# Altium footprint library NASCO 3D PCBLIB.PcbLib: 108 footprints (part 1 of 7)
Each footprint in its own frame and in the unit in brackets; x right, y up, seen from the top. Pads: shape width x height; smd on the part's side, far side on the other; paste and mask are expansions set on the pad; w line width, h text height; cw(c..) or ccw(c..) is an arc to the next point about the centre after c.
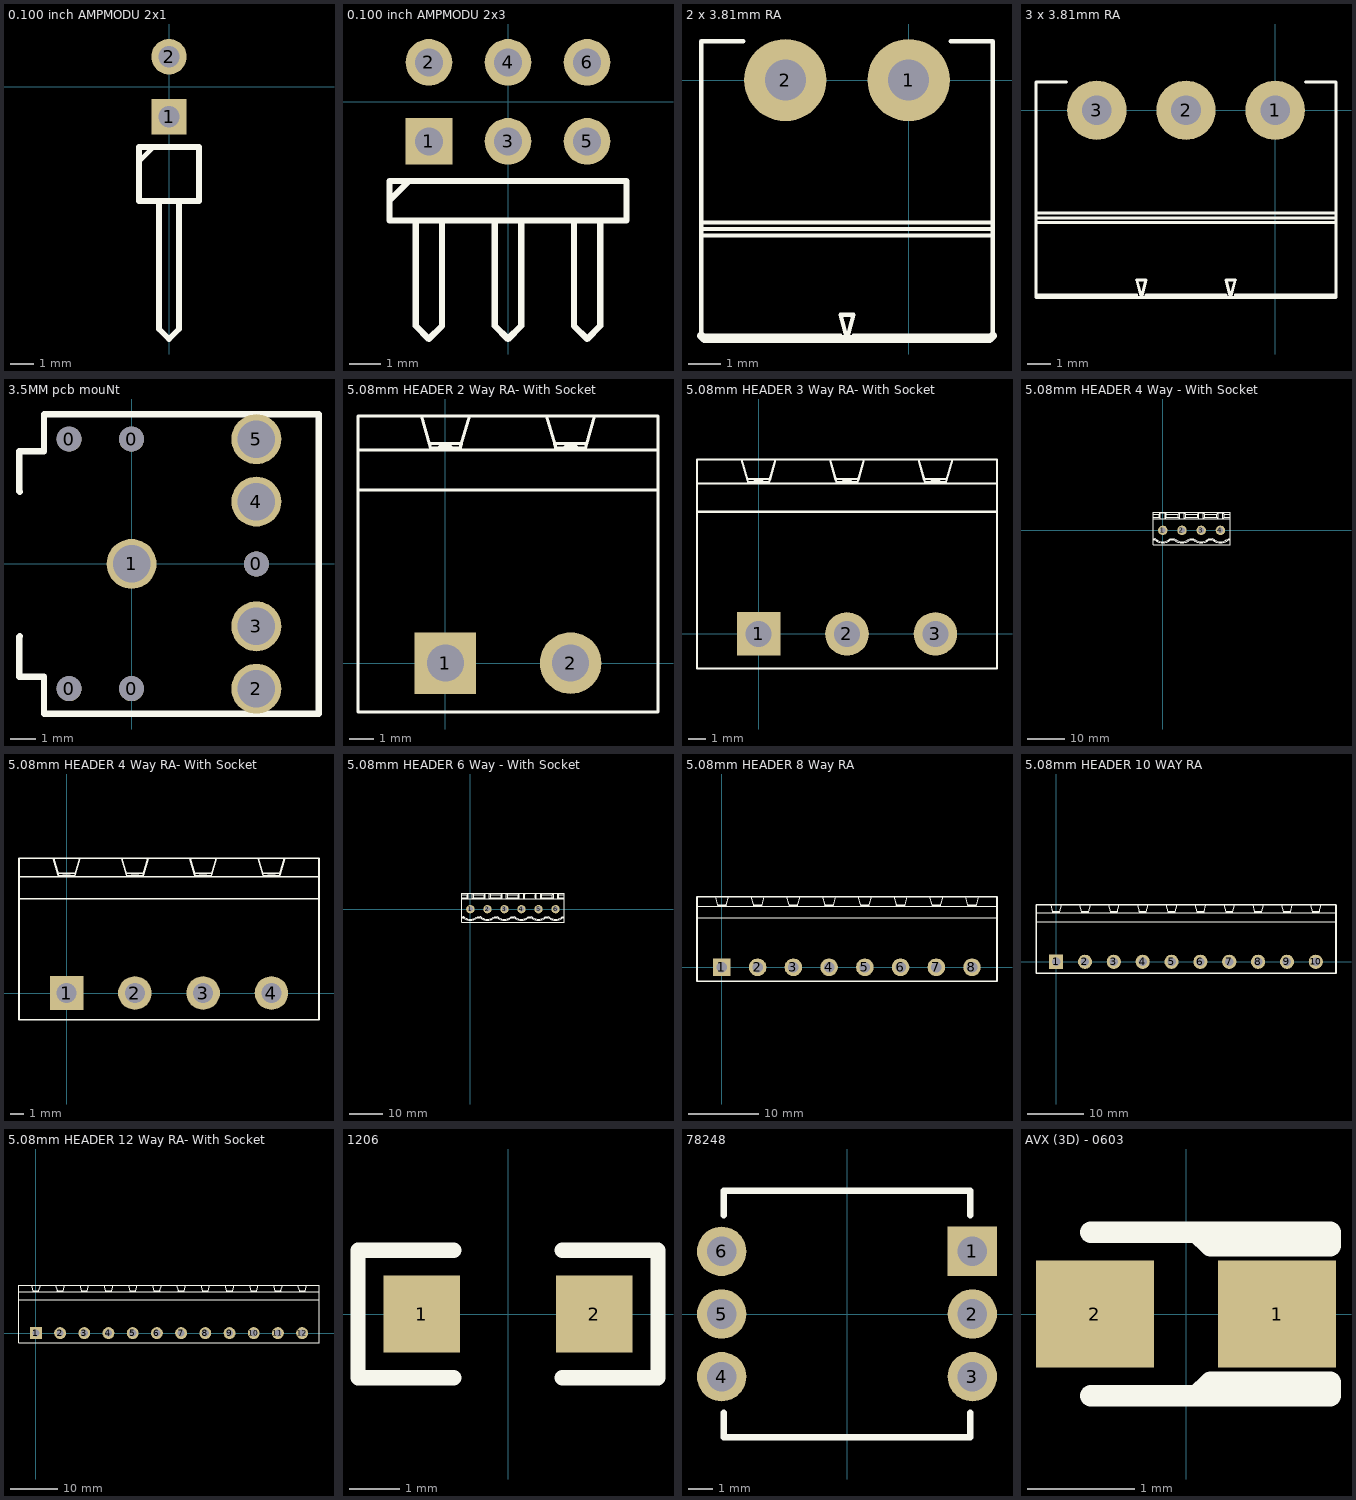
[diagram p0: the footprints below, top view; thin cyan lines are the x and y axes]

## 0.100 inch AMPMODU 2x1 [mm] "0.100 inch AMPMODU 2x1"
pads (2):
  rect 1.5x1.5 hole 0.9: 1(0,-1.27)
  round 1.5 hole 0.9: 2(0,1.27)
Top Overlay:
  lines w0.2: -1.27,-3.81 -1.27,-2.54 ; -1.27,-3.175 -0.635,-2.54 ; -0.423,-6.858 -0.423,-10.245 0,-10.668 0.423,-10.245 0.423,-6.858 ; 1.27,-3.81 1.27,-2.54
  lines w0.254: -0.423,-4.868 -0.423,-10.245 0,-10.668 ; 0.508,-4.826 0.423,-4.911 0.423,-10.245 0,-10.668 ; -1.27,-2.54 1.27,-2.54 ; -1.27,-2.54 -1.27,-4.826 1.27,-4.826 1.27,-2.54 ; -1.27,-2.54 1.27,-2.54 ; 0,-10.668 0,-10.668 ; 0,-10.668 0,-10.668
3D body "c-103330-1-m-3d.stp": height 6.06, standoff -3.03, extent -1.067,-10.649 1.067,1.6

## 0.100 inch AMPMODU 2x3 [mm] "0.100 inch AMPMODU 2x3"
pads (6):
  rect 1.5x1.5 hole 0.9: 1(-2.54,-1.27)
  round 1.5 hole 0.9: 2(-2.54,1.27) 3(0,-1.27) 4(0,1.27) 5(2.54,-1.27) 6(2.54,1.27)
Top Overlay:
  lines w0.2: -3.81,-3.175 -3.175,-2.54 ; -2.963,-3.81 -2.963,-7.197 -2.54,-7.62 -2.117,-7.197 -2.117,-3.81 ; -0.423,-3.81 -0.423,-7.197 0,-7.62 0.423,-7.197 0.423,-3.81 ; 2.117,-3.81 2.117,-7.197 2.54,-7.62 2.963,-7.197 2.963,-3.81 ; -3.81,-3.81 3.81,-3.81 3.81,-2.54 -3.81,-2.54 -3.81,-3.81
3D body "Tyco 103149-3.stp": height 6.06, standoff -3.03, extent -3.613,-10.655 3.601,1.6

## 2 x 3.81mm RA [mm]
height 4.58
pads (2):
  round 2.54 hole 1.27: 1(0,0) 2(-3.81,0)
Top Overlay:
  lines w0.127: -5.515,-7.9 -2.105,-7.9 ; -5.11,1.2 -6.41,1.2 -6.41,0.7 -6.41,0.489 -6.41,0.377 -6.41,-0.398 -6.41,-0.574 -6.41,-0.587 -6.41,-0.627 -6.41,-0.656 -6.41,-0.745 -6.41,-0.965 -6.41,-1.055 -6.41,-1.084 -6.41,-1.124 -6.41,-1.312 -6.41,-1.8 -6.41,-1.958 -6.41,-2.089 -6.41,-2.3 -6.41,-4.4 ; 1.3,1.2 2.6,1.2 2.6,0.7 2.6,0.489 2.6,0.377 2.6,-0.398 2.6,-0.574 2.6,-0.587 2.6,-0.627 2.6,-0.656 2.6,-0.745 2.6,-0.965 2.6,-1.055 2.6,-1.084 2.6,-1.124 2.6,-1.312 2.6,-1.8 2.6,-1.958 2.6,-2.089 2.6,-2.3 2.6,-4.4 ; -6.41,-4.8 2.6,-4.8 ; -6.41,-4.8 -6.41,-7.9 -2.105,-7.9 ; -6.41,-4.8 -6.41,-4.6 ; -6.41,-4.6 2.6,-4.6 ; -6.41,-4.6 -6.41,-4.4 ; -6.41,-4.4 2.6,-4.4 ; -2.106,-7.25 -1.905,-8 ; -2.106,-7.25 -1.704,-7.25 ; -2.106,-7.25 -1.704,-7.25 ; -2.106,-7.25 -1.905,-8 ; -2.105,-7.9 -2.105,-8 -2.105,-7.9 ; -1.905,-8 -1.704,-7.25 ; -1.905,-8 -1.704,-7.25 ; -1.705,-7.9 2.6,-7.9 2.6,-4.8 ; -1.705,-7.9 -1.705,-8 -1.705,-7.9 ; 2.6,-4.8 2.6,-4.6 ; 2.6,-4.6 2.6,-4.4
  lines w0.254: -6.41,-7.9 -6.31,-8 -1.705,-8 2.5,-8 2.6,-7.9
3D body "1803578.stp": height 3.05, standoff -8.05, extent -6.11,-17.501 2.3,-1.401
3D body "c-284513-2-c-3d.stp": height 7.32, standoff -3.38, extent -6.86,-8.006 3.05,1.194

## 3 x 3.81mm RA [mm]
height 4.58
pads (3):
  round 2.54 hole 1.27: 1(0,0) 2(-3.81,0) 3(-7.62,0)
Top Overlay:
  lines w0.127: -8.92,1.2 -10.22,1.2 -10.22,0.7 -10.22,-0.65 -10.22,-1.4 -10.22,-4.4 ; 1.3,1.2 2.6,1.2 2.6,0.7 2.6,0.489 2.6,0.377 2.6,-0.398 2.6,-0.574 2.6,-0.587 2.6,-0.627 2.6,-0.656 2.6,-0.745 2.6,-0.965 2.6,-1.055 2.6,-1.084 2.6,-1.124 2.6,-1.312 2.6,-1.8 2.6,-1.958 2.6,-2.089 2.6,-2.3 2.6,-4.4 ; -10.22,-7.9 -10.22,-4.8 ; -10.22,-7.9 -10.22,-8 -9.325,-8 -9.11,-8 -8.875,-8 -8.474,-8 -8.22,-8 -8.02,-8 -7.22,-8 -7.02,-8 -6.766,-8 -6.365,-8 -6.13,-8 -5.915,-8 ; -10.22,-7.9 -5.915,-7.9 -5.915,-8 ; -10.22,-4.8 -10.22,-4.6 ; -10.22,-4.8 2.6,-4.8 ; -10.22,-4.6 -10.22,-4.4 ; -10.22,-4.6 2.6,-4.6 ; -10.22,-4.4 2.6,-4.4 ; -5.915,-8 -5.903,-8 -5.715,-8 ; -5.715,-8 -5.514,-7.25 -5.916,-7.25 -5.715,-8 ; -5.715,-8 -5.527,-8 -5.515,-8 ; -5.515,-8 -5.3,-8 -5.065,-8 -4.664,-8 -4.41,-8 -4.21,-8 -3.41,-8 -3.21,-8 -2.956,-8 -2.555,-8 -2.32,-8 -2.105,-8 ; -5.515,-8 -5.515,-7.9 -2.105,-7.9 -2.105,-8 ; -2.105,-8 -2.093,-8 -1.905,-8 ; -1.905,-8 -1.704,-7.25 -2.106,-7.25 -1.905,-8 ; -1.905,-8 -1.717,-8 -1.705,-8 ; -1.705,-8 -1.49,-8 -1.255,-8 -0.854,-8 -0.6,-8 -0.4,-8 0.4,-8 0.6,-8 0.854,-8 1.255,-8 1.49,-8 1.705,-8 2.6,-8 2.6,-7.9 ; -1.705,-8 -1.705,-7.9 2.6,-7.9 ; 2.6,-7.9 2.6,-4.8 ; 2.6,-4.8 2.6,-4.6 ; 2.6,-4.6 2.6,-4.4
3D body "1803581.stp": height 3.05, standoff -8.05, extent -9.971,-17.577 2.249,-1.477
3D body "c-284513-3-c-3d.stp": height 7.32, standoff -3.38, extent -10.663,-8.006 3.057,1.194

## 3.5MM pcb mouNt [mm]
pads (10):
  round 1 hole 1: 0(-2.5,-5) 0(-2.5,5) 0(0,-5) 0(0,5) 0(5,0)
  round 2 hole 1.5: 1(0,0) 2(5,-5) 3(5,-2.5) 4(5,2.5) 5(5,5)
Top Overlay:
  lines w0.254: -4.484,-2.898 -4.502,-2.917 -4.502,-4.514 -3.511,-4.514 -3.511,-5.987 -3.486,-6.013 ; -4.484,2.894 -4.502,2.912 -4.502,4.51 -3.511,4.51 -3.511,5.983 -3.486,6.008 ; -3.499,-6 7.5,-6 ; -3.499,5.995 7.5,5.995 7.501,5.994 ; 7.501,-5.999 7.501,5.994 ; 7.501,-5.999 7.501,5.994
3D body "SJ1-3525NG-PI.stp": height 5.52, standoff -3.28, extent -6.549,-5.999 7.501,6.001

## 5.08mm HEADER 2 Way RA- With Socket [mm] "PHOENIX CONTACT 1757019 & 1759017"
pads (2):
  rect 2.5x2.5 hole 1.5: 1(0,0)
  round 2.5 hole 1.5: 2(5.08,0)
Top Overlay:
  lines w0.127: -0.656,8.899 0.656,8.899 ; -0.245,8.719 -0.232,8.769 0.232,8.769 0.245,8.719 ; -0.047,-1.981 ccw(c0,-1.484) 0.047,-1.981 ; 4.424,8.899 5.736,8.899 ; 4.835,8.719 4.848,8.769 5.312,8.769 5.325,8.719 ; 5.033,-1.981 ccw(c5.08,-1.484) 5.127,-1.981 ; 8.611,7.019 -3.54,7.019 ; 8.611,8.645 -3.54,8.645 ; 8.611,10.019 7.234,10.019 6.055,10.019 ; 8.62,10.019 8.62,8.645 8.62,7.019 8.62,1.369 8.62,1.169 8.62,1.044 8.62,0.894 8.62,0.43 8.62,0.251 8.62,0.213 8.62,0.186 8.62,0.101 8.62,-0.109 8.62,-0.193 8.62,-0.221 8.62,-0.259 8.62,-0.271 8.62,-0.438 8.62,-1.174 8.62,-1.281 8.62,-1.481 8.62,-1.981 6.58,-1.981 3.58,-1.981 1.5,-1.981 -1.5,-1.981 -3.54,-1.981 -3.54,-1.481 -3.54,-1.281 -3.54,-1.174 -3.54,-0.438 -3.54,-0.271 -3.54,-0.259 -3.54,-0.221 -3.54,-0.193 -3.54,-0.109 -3.54,0.101 -3.54,0.186 -3.54,0.213 -3.54,0.251 -3.54,0.43 -3.54,0.894 -3.54,1.044 -3.54,1.169 -3.54,1.369 -3.54,7.019 ; -3.54,7.019 -3.54,8.645 ; -3.54,8.645 -3.54,10.019 -2.54,10.019 -2.154,10.019 -0.975,10.019 ; -0.975,10.019 -0.644,8.856 -0.605,8.719 0.605,8.719 0.644,8.856 0.975,10.019 ; -0.975,10.019 0.975,10.019 ; 0.975,10.019 2.154,10.019 2.926,10.019 4.105,10.019 ; 4.105,10.019 6.055,10.019 ; 4.105,10.019 4.436,8.856 4.475,8.719 5.685,8.719 5.724,8.856 6.055,10.019
3D body "1757019.stp": height 15.02, standoff 0.02, extent -2.489,0.977 7.671,19.177
3D body "1759017.stp": height 8.62, standoff -3.48, extent -2.54,-2.007 7.62,9.996

## 5.08mm HEADER 3 Way RA- With Socket [mm] "PHOENIX CONTACT 1757255 & 1757022"
pads (3):
  rect 2.5x2.5 hole 1.5: 1(0,0)
  round 2.5 hole 1.5: 2(5.08,0) 3(10.16,0)
Top Overlay:
  lines w0.127: -0.656,8.899 0.656,8.899 ; -0.245,8.719 -0.232,8.769 0.232,8.769 0.245,8.719 ; -0.047,-1.981 ccw(c0,-1.484) 0.047,-1.981 ; 4.424,8.899 5.736,8.899 ; 4.835,8.719 4.848,8.769 5.312,8.769 5.325,8.719 ; 5.033,-1.981 ccw(c5.08,-1.484) 5.127,-1.981 ; 9.504,8.899 10.816,8.899 ; 9.915,8.719 9.928,8.769 10.392,8.769 10.405,8.719 ; 10.113,-1.981 ccw(c10.16,-1.484) 10.207,-1.981 ; -3.54,7.019 -3.54,8.645 ; -3.54,7.019 -3.54,1.369 -3.54,1.169 -3.54,1.044 -3.54,0.894 -3.54,0.43 -3.54,0.251 -3.54,0.213 -3.54,0.186 -3.54,0.101 -3.54,-0.109 -3.54,-0.193 -3.54,-0.221 -3.54,-0.259 -3.54,-0.271 -3.54,-0.438 -3.54,-1.174 -3.54,-1.281 -3.54,-1.481 -3.54,-1.981 -1.5,-1.981 1.5,-1.981 3.58,-1.981 6.58,-1.981 8.66,-1.981 11.66,-1.981 13.7,-1.981 13.7,1.069 13.7,1.819 13.7,7.019 ; -3.54,7.019 13.7,7.019 ; -3.54,8.645 13.7,8.645 ; -3.54,8.645 -3.54,10.019 -2.54,10.019 -2.154,10.019 -0.975,10.019 ; -0.975,10.019 -0.644,8.856 -0.605,8.719 0.605,8.719 0.644,8.856 0.975,10.019 ; -0.975,10.019 0.975,10.019 ; 0.975,10.019 2.154,10.019 2.926,10.019 4.105,10.019 ; 4.105,10.019 6.055,10.019 ; 4.105,10.019 4.436,8.856 4.475,8.719 5.685,8.719 5.724,8.856 6.055,10.019 ; 6.055,10.019 7.234,10.019 8.006,10.019 9.185,10.019 ; 9.185,10.019 11.135,10.019 ; 9.185,10.019 9.516,8.856 9.555,8.719 10.765,8.719 10.804,8.856 11.135,10.019 ; 11.135,10.019 12.314,10.019 12.7,10.019 13.7,10.019 13.7,8.645 ; 13.7,7.019 13.7,8.645
3D body "1757255.stp": height 8.62, standoff -3.48, extent -3.54,-2.007 13.7,9.996
3D body "1757022.stp": height 15.02, standoff 0.02, extent -2.489,0.977 12.751,19.177

## 5.08mm HEADER 4 Way - With Socket [mm] "PHOENIX CONTACT 1758034 & 1758035"
pads (4):
  round 2.5 hole 1.5: 1(0,0) 2(5.08,0) 3(10.16,0) 4(15.24,0)
Top Overlay:
  lines w0.127: -2.54,-2.491 -2.54,-3.861 -1.5,-3.861 1.5,-3.861 3.58,-3.861 6.58,-3.861 8.66,-3.861 11.66,-3.861 13.74,-3.861 16.74,-3.861 17.78,-3.861 17.78,-2.491 ; -2.54,-2.491 -2.54,-2.191 ; -2.54,-2.491 -2.154,-2.491 ; -2.54,-2.191 -2.54,-0.192 -2.54,0.009 -2.54,0.21 -2.54,3.103 ; -2.54,-2.191 -2.04,-2.191 ; -2.54,3.103 -0.644,3.103 ; -2.54,3.103 -2.54,3.414 ; -2.54,3.414 -0.975,3.414 ; -2.54,3.414 -2.54,3.809 -2.54,4.239 ; -2.54,4.239 -2.54,4.739 17.78,4.739 17.78,4.239 ; -2.54,4.239 -0.975,4.239 ; -2.154,-2.491 ccw(c0,0.009) 2.154,-2.491 ; -2.154,-2.491 -2.126,-2.415 -2.098,-2.341 cw(c13.682,-8.357) -2.04,-2.191 ; -2.04,-2.191 ccw(c0,0.009) 2.04,-2.191 ; -0.975,3.414 -0.975,4.239 ; -0.975,3.414 -0.644,3.103 ; -0.975,4.239 -0.605,4.712 ; -0.644,3.103 -0.605,3.103 ; -0.605,3.103 -0.605,4.712 ; -0.605,3.103 0.605,3.103 ; -0.605,4.712 0.605,4.712 ; 0.605,3.103 0.605,4.712 ; 0.605,3.103 0.644,3.103 ; 0.605,4.712 0.975,4.239 ; 0.644,3.103 4.436,3.103 ; 0.644,3.103 0.975,3.414 ; 0.975,3.414 4.105,3.414 ; 0.975,3.414 0.975,4.239 ; 0.975,4.239 4.105,4.239 ; 2.04,-2.191 2.069,-2.265 2.098,-2.341 cw(c-15.111,-8.902) 2.154,-2.491 ; 2.04,-2.191 3.04,-2.191 ; 2.154,-2.491 2.926,-2.491 ; 2.926,-2.491 ccw(c5.08,0.009) 7.234,-2.491 ; 2.926,-2.491 2.954,-2.416 2.982,-2.341 cw(c18.814,-8.377) 3.04,-2.191 ; 3.04,-2.191 ccw(c5.08,0.009) 7.12,-2.191 ; 4.105,3.414 4.105,4.239 ; 4.105,3.414 4.436,3.103 ; 4.105,4.239 4.475,4.712 ; 4.436,3.103 4.475,3.103 ; 4.475,3.103 4.475,4.712 ; 4.475,3.103 5.685,3.103 ; 4.475,4.712 5.685,4.712 ; 5.685,3.103 5.685,4.712 ; 5.685,3.103 5.724,3.103 ; 5.685,4.712 6.055,4.239 ; 5.724,3.103 9.516,3.103 ; 5.724,3.103 6.055,3.414 ; 6.055,3.414 6.055,4.239 ; 6.055,3.414 9.185,3.414 ; 6.055,4.239 9.185,4.239 ; 7.12,-2.191 7.149,-2.265 7.178,-2.341 cw(c-10.031,-8.902) 7.234,-2.491 ; 7.12,-2.191 8.12,-2.191 ; 7.234,-2.491 8.006,-2.491 ; 8.006,-2.491 ccw(c10.16,0.009) 12.314,-2.491 ; 8.006,-2.491 8.034,-2.415 8.062,-2.341 cw(c23.842,-8.357) 8.12,-2.191 ; 8.12,-2.191 ccw(c10.16,0.009) 12.2,-2.191 ; 9.185,3.414 9.185,4.239 ; 9.185,3.414 9.516,3.103 ; 9.185,4.239 9.555,4.712 ; 9.516,3.103 9.555,3.103 ; 9.555,3.103 9.555,4.712 ; 9.555,3.103 10.765,3.103 ; 9.555,4.712 10.765,4.712 ; 10.765,3.103 10.765,4.712 ; 10.765,3.103 10.804,3.103 ; 10.765,4.712 11.135,4.239 ; 10.804,3.103 11.135,3.414 ; 10.804,3.103 14.596,3.103 ; 11.135,3.414 11.135,4.239 ; 11.135,3.414 14.265,3.414 ; 11.135,4.239 14.265,4.239 ; 12.2,-2.191 12.229,-2.265 12.258,-2.341 cw(c-4.951,-8.902) 12.314,-2.491 ; 12.2,-2.191 13.2,-2.191 ; 12.314,-2.491 13.086,-2.491 ; 13.086,-2.491 ccw(c15.24,0.009) 17.394,-2.491 ; 13.086,-2.491 13.114,-2.415 13.142,-2.341 cw(c28.922,-8.357) 13.2,-2.191 ; 13.2,-2.191 ccw(c15.24,0.009) 17.28,-2.191 ; 14.265,3.414 14.265,4.239 ; 14.265,3.414 14.596,3.103 ; 14.265,4.239 14.635,4.712 ; 14.596,3.103 14.635,3.103 ; 14.635,3.103 14.635,4.712 ; 14.635,3.103 15.845,3.103 ; 14.635,4.712 15.845,4.712 ; 15.845,3.103 15.845,4.712 ; 15.845,3.103 15.884,3.103 ; 15.845,4.712 16.215,4.239 ; 15.884,3.103 16.215,3.414 ; 15.884,3.103 17.78,3.103 ; 16.215,3.414 16.215,4.239 ; 16.215,3.414 17.78,3.414 ; 16.215,4.239 17.78,4.239 ; 17.28,-2.191 17.309,-2.265 17.338,-2.341 cw(c0.196,-8.877) 17.394,-2.491 ; 17.28,-2.191 17.78,-2.191 ; 17.394,-2.491 17.78,-2.491 ; 17.78,-2.491 17.78,-2.191 ; 17.78,-2.191 17.78,0.459 17.78,0.659 17.78,0.784 17.78,0.934 17.78,1.398 17.78,1.577 17.78,1.615 17.78,1.642 17.78,1.727 17.78,1.937 17.78,2.021 17.78,2.049 17.78,2.087 17.78,2.099 17.78,2.266 17.78,3.002 17.78,3.103 ; 17.78,3.103 17.78,3.109 17.78,3.309 17.78,3.414 ; 17.78,3.414 17.78,3.809 17.78,4.239
3D body "1757035.stp": height 22, standoff 3.8, extent -2.54,-3.861 17.78,11.139
3D body "1758034.stp": height 11.6, standoff -4.3, extent -2.54,-3.861 17.78,4.739

## 5.08mm HEADER 4 Way RA- With Socket [mm] "PHOENIX CONTACT 1757035 & 1759033"
pads (4):
  rect 2.5x2.5 hole 1.5: 1(0,0)
  round 2.5 hole 1.5: 2(5.08,0) 3(10.16,0) 4(15.24,0)
Top Overlay:
  lines w0.127: -0.656,8.899 0.656,8.899 ; -0.245,8.719 -0.232,8.769 0.232,8.769 0.245,8.719 ; -0.047,-1.981 ccw(c0,-1.484) 0.047,-1.981 ; 4.424,8.899 5.736,8.899 ; 4.835,8.719 4.848,8.769 5.312,8.769 5.325,8.719 ; 5.033,-1.981 ccw(c5.08,-1.484) 5.127,-1.981 ; 6.096,-1.981 9.347,-1.981 ; 6.58,-1.981 3.58,-1.981 1.5,-1.981 -1.5,-1.981 -3.54,-1.981 -3.54,-1.481 -3.54,-1.281 -3.54,-1.174 -3.54,-0.438 -3.54,-0.271 -3.54,-0.259 -3.54,-0.221 -3.54,-0.193 -3.54,-0.109 -3.54,0.101 -3.54,0.186 -3.54,0.213 -3.54,0.251 -3.54,0.43 -3.54,0.894 -3.54,1.044 -3.54,1.169 -3.54,1.369 -3.54,7.019 ; 6.62,7.019 18.771,7.019 ; 6.62,8.645 18.771,8.645 ; 6.985,10.019 8.763,10.019 ; 7.234,10.019 6.055,10.019 ; 8.006,10.019 9.185,10.019 ; 8.611,7.019 -3.54,7.019 ; 8.611,8.645 -3.54,8.645 ; 8.66,-1.981 11.66,-1.981 13.74,-1.981 16.74,-1.981 18.78,-1.981 18.78,-1.481 18.78,-1.281 18.78,-1.174 18.78,-0.438 18.78,-0.271 18.78,-0.259 18.78,-0.221 18.78,-0.193 18.78,-0.109 18.78,0.101 18.78,0.186 18.78,0.213 18.78,0.251 18.78,0.43 18.78,0.894 18.78,1.044 18.78,1.169 18.78,1.369 18.78,7.019 18.78,8.645 18.78,10.019 ; 9.504,8.899 10.816,8.899 ; 9.915,8.719 9.928,8.769 10.392,8.769 10.405,8.719 ; 10.113,-1.981 ccw(c10.16,-1.484) 10.207,-1.981 ; 14.584,8.899 15.896,8.899 ; 14.995,8.719 15.008,8.769 15.472,8.769 15.485,8.719 ; 15.193,-1.981 ccw(c15.24,-1.484) 15.287,-1.981 ; 18.771,10.019 17.394,10.019 16.215,10.019 ; -3.54,7.019 -3.54,8.645 ; -3.54,8.645 -3.54,10.019 -2.54,10.019 -2.154,10.019 -0.975,10.019 ; -0.975,10.019 0.975,10.019 ; -0.975,10.019 -0.644,8.856 -0.605,8.719 0.605,8.719 0.644,8.856 0.975,10.019 ; 0.975,10.019 2.154,10.019 2.926,10.019 4.105,10.019 ; 4.105,10.019 4.436,8.856 4.475,8.719 5.685,8.719 5.724,8.856 6.055,10.019 ; 4.105,10.019 6.055,10.019 ; 9.185,10.019 9.516,8.856 9.555,8.719 10.765,8.719 10.804,8.856 11.135,10.019 ; 9.185,10.019 11.135,10.019 ; 11.135,10.019 12.314,10.019 13.086,10.019 14.265,10.019 ; 14.265,10.019 16.215,10.019 ; 14.265,10.019 14.596,8.856 14.635,8.719 15.845,8.719 15.884,8.856 16.215,10.019
3D body "1757019.stp": height 15.02, standoff 0.02, extent 7.671,0.977 17.831,19.177
3D body "1759017.stp": height 8.62, standoff -3.48, extent 7.62,-2.007 17.78,9.996
3D body "1759017.stp": height 8.62, standoff -3.48, extent -2.54,-2.007 7.62,9.996
3D body "1757019.stp": height 15.02, standoff 0.02, extent -2.489,0.977 7.671,19.177

## 5.08mm HEADER 6 Way - With Socket [mm] "PHOENIX CONTACT 1758050 & 1757051"
pads (6):
  round 2.5 hole 1.5: 1(0,0) 2(5.08,0) 3(10.16,0) 4(15.24,0) 5(20.32,0) 6(25.4,0)
Top Overlay:
  drawing of 212 lines, arcs and shapes, not listed
3D body "1757051.stp": height 22.02, standoff 3.81, extent -2.551,-3.878 27.935,11.122
3D body "1758050.stp": height 12.02, standoff -3.88, extent -2.548,-3.878 27.932,4.722

## 5.08mm HEADER 8 Way RA [mm] "PHOENIX CONTACT 1757019 & 1759017"
pads (8):
  rect 2.5x2.5 hole 1.5: 1(0,0)
  round 2.5 hole 1.5: 2(5.08,0) 3(10.16,0) 4(15.24,0) 5(20.32,0) 6(25.4,0) 7(30.48,0) 8(35.56,0)
Top Overlay:
  drawing of 179 lines, arcs and shapes, not listed
3D body "1757019.stp": height 15.02, standoff 0.02, extent 27.94,0.965 38.1,19.165
3D body "1759017.stp": height 8.62, standoff -3.48, extent 27.94,-2.007 38.1,9.996
3D body "1757019.stp": height 15.02, standoff 0.02, extent 17.78,0.965 27.94,19.165
3D body "1759017.stp": height 8.62, standoff -3.48, extent 17.78,-2.007 27.94,9.996
3D body "1757019.stp": height 15.02, standoff 0.02, extent 7.62,0.965 17.78,19.165
3D body "1759017.stp": height 8.62, standoff -3.48, extent 7.62,-2.007 17.78,9.996
3D body "1759017.stp": height 8.62, standoff -3.48, extent -2.54,-2.007 7.62,9.996
3D body "1757019.stp": height 15.02, standoff 0.02, extent -2.54,0.965 7.62,19.165

## 5.08mm HEADER 10 WAY RA [mm] "PHOENIX CONTACT"
pads (10):
  rect 2.5x2.5 hole 1.5: 1(0,0)
  round 2.5 hole 1.5: 2(5.08,0) 3(10.16,0) 4(15.24,0) 5(20.32,0) 6(25.4,0) 7(30.48,0) 8(35.56,0) 9(40.64,0) 10(45.72,0)
Top Overlay:
  drawing of 212 lines, arcs and shapes, not listed
3D body "1757019.stp": height 15.02, standoff 0.02, extent 27.94,0.965 38.1,19.165
3D body "1759017.stp": height 8.62, standoff -3.48, extent 27.94,-2.007 38.1,9.996
3D body "1757019.stp": height 15.02, standoff 0.02, extent 17.78,0.965 27.94,19.165
3D body "1759017.stp": height 8.62, standoff -3.48, extent 17.78,-2.007 27.94,9.996
3D body "1757019.stp": height 15.02, standoff 0.02, extent 7.62,0.965 17.78,19.165
3D body "1759017.stp": height 8.62, standoff -3.48, extent 7.62,-2.007 17.78,9.996
3D body "1759017.stp": height 8.62, standoff -3.48, extent -2.54,-2.007 7.62,9.996
3D body "1757019.stp": height 15.02, standoff 0.02, extent -2.54,0.965 7.62,19.165
3D body "1759017.stp": height 8.62, standoff -3.48, extent 38.1,-2.007 48.26,9.996
3D body "1757019.stp": height 15.02, standoff 0.02, extent 38.1,0.965 48.26,19.165

## 5.08mm HEADER 12 Way RA- With Socket [mm] "PHOENIX CONTACT ??"
pads (12):
  rect 2.5x2.5 hole 1.5: 1(0,0)
  round 2.5 hole 1.5: 2(5.08,0) 3(10.16,0) 4(15.24,0) 5(20.32,0) 6(25.4,0) 7(30.48,0) 8(35.56,0) 9(40.64,0) 10(45.72,0) 11(50.8,0) 12(55.88,0)
Top Overlay:
  drawing of 263 lines, arcs and shapes, not listed
3D body "1757019.stp": height 15.02, standoff 0.02, extent 48.311,0.977 58.471,19.177
3D body "1759017.stp": height 8.62, standoff -3.48, extent 48.26,-2.007 58.42,9.996
3D body "1759017.stp": height 8.62, standoff -3.48, extent 38.1,-2.007 48.26,9.996
3D body "1757019.stp": height 15.02, standoff 0.02, extent 38.151,0.977 48.311,19.177
3D body "1759017.stp": height 8.62, standoff -3.48, extent 27.94,-2.007 38.1,9.996
3D body "1757019.stp": height 15.02, standoff 0.02, extent 27.991,0.977 38.151,19.177
3D body "1759017.stp": height 8.62, standoff -3.48, extent 17.78,-2.007 27.94,9.996
3D body "1757019.stp": height 15.02, standoff 0.02, extent 17.831,0.977 27.991,19.177
3D body "1759017.stp": height 8.62, standoff -3.48, extent 7.62,-2.007 17.78,9.996
3D body "1757019.stp": height 15.02, standoff 0.02, extent 7.671,0.977 17.831,19.177
3D body "1757019.stp": height 15.02, standoff 0.02, extent -2.489,0.977 7.671,19.177
3D body "1759017.stp": height 8.62, standoff -3.48, extent -2.54,-2.007 7.62,9.996

## 1206 [mil]
height 27.95
pads (2):
  rect 60x60 smd: 1(-67.5,0) 2(67.5,0)
Top Overlay:
  lines w12: -42.5,-50 -117.5,-50 -117.5,50 -42.5,50 ; 42.5,-50 117.5,-50 117.5,50 42.5,50
3D body "r1206.stp": height 21.65, standoff 0, extent -62.99,-31.5 62.99,31.5

## 78248 [mm]
pads (6):
  rect 2x2 hole 1.2: 1(5.08,2.54)
  round 2 hole 1.2: 2(5.08,0) 3(5.08,-2.54) 4(-5.08,-2.54) 5(-5.08,0) 6(-5.08,2.54)
Top Overlay:
  lines w0.254: -5,-4 -5,-5 5,-5 5,-4 ; -5,4 -5,5 5,5 5,4
3D body: height 6.35, standoff 0, extent -5,-5 5,5

## AVX (3D) - 0603 [mm]
height 0.025
pads (2):
  rect 1.1x1 smd: 1(0.85,0) 2(-0.85,0)
Top Overlay:
  lines w0.2: -0.889,-0.762 0.889,-0.762 1.346,-0.762 1.346,-0.635 0.229,-0.635 0.102,-0.762 ; -0.889,0.762 0.889,0.762 1.346,0.762 1.346,0.635 0.229,0.635 0.102,0.762
3D body: height 0.92, standoff 0, extent -0.5,-0.4 0.5,0.4
3D body: height 0.92, standoff 0, extent 0.5,-0.4 0.8,0.4
3D body: height 0.92, standoff 0, extent -0.8,-0.4 -0.5,0.4